# Altium footprint library Connect.PcbLib: 272 footprints (part 1 of 17)
Each footprint in its own frame and in the unit in brackets; x right, y up, seen from the top. Pads: shape width x height; smd on the part's side, far side on the other; paste and mask are expansions set on the pad; w line width, h text height; cw(c..) or ccw(c..) is an arc to the next point about the centre after c.
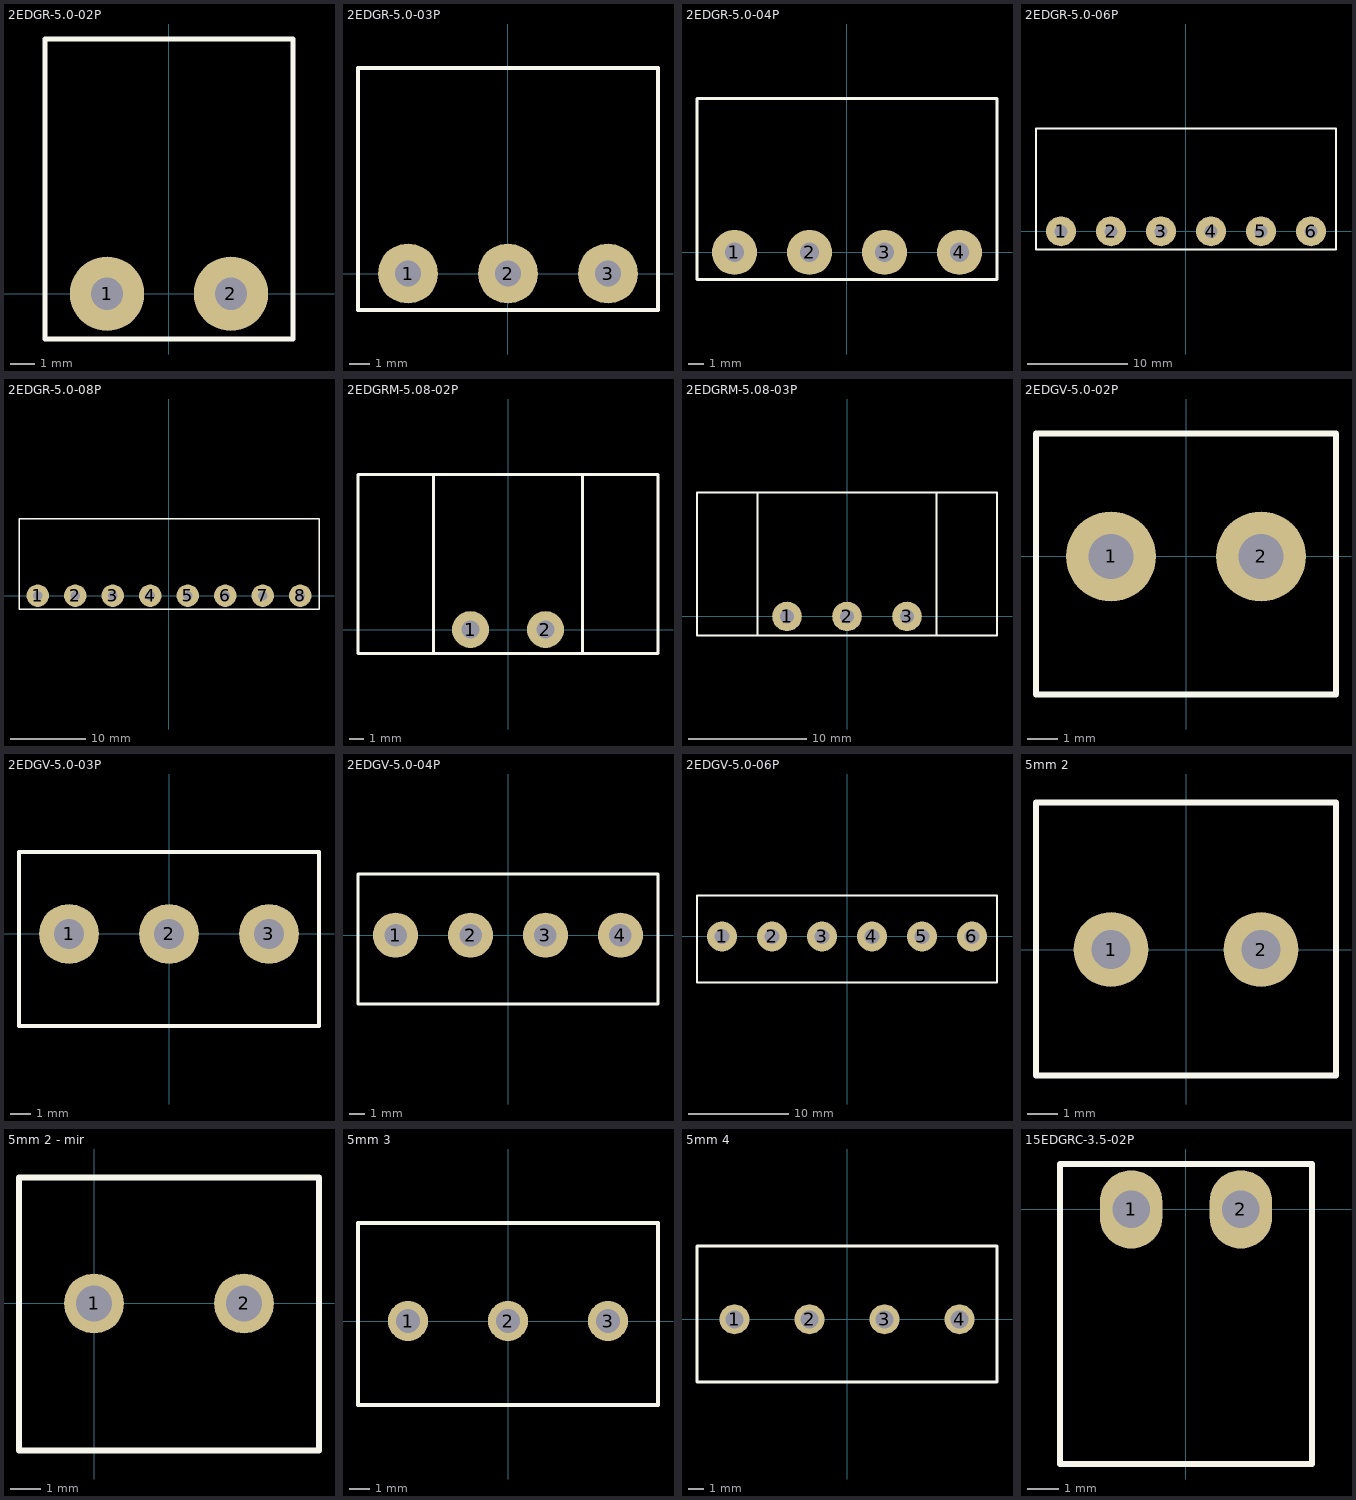
[diagram p0: the footprints below, top view; thin cyan lines are the x and y axes]

## 2EDGR-5.0-02P [mm]
pads (2):
  round 3 hole 1.3: 1(-2.5,0) 2(2.5,0)
Top Overlay:
  lines w0.2: -5,-1.825 -5,10.275 5,10.275 5,-1.825 -5,-1.825
3D body "5mm_2P.STEP": height 8.47, standoff -4, extent -5,-1.75 5,10.25

## 2EDGR-5.0-03P [mm]
pads (3):
  round 3 hole 1.3: 1(-5,0) 2(0,0) 3(5,0)
Top Overlay:
  lines w0.2: -7.5,-1.825 -7.5,10.275 7.5,10.275 7.5,-1.825 -7.5,-1.825
3D body "5mm_2P.STEP": height 8.47, standoff -4, extent -2.5,-1.75 7.5,10.25
3D body "5mm_2P.STEP": height 8.47, standoff -4, extent -7.5,-1.75 2.5,10.25

## 2EDGR-5.0-04P [mm]
pads (4):
  round 3 hole 1.3: 1(-7.5,0) 2(-2.5,0) 3(2.5,0) 4(7.5,0)
Top Overlay:
  lines w0.2: -5,-1.825 5,-1.825 ; -5,10.275 5,10.275 ; -10,-1.825 0,-1.825 10,-1.825 10,10.275 0,10.275 -10,10.275 -10,-1.825
3D body "5mm_2P.STEP": height 8.47, standoff -4, extent 0,-1.75 10,10.25
3D body "5mm_2P.STEP": height 8.47, standoff -4, extent -10,-1.75 0,10.25

## 2EDGR-5.0-06P [mm]
pads (6):
  round 3 hole 1.3: 1(-12.5,0) 2(-7.5,0) 3(-2.5,0) 4(2.5,0) 5(7.5,0) 6(12.5,0)
Top Overlay:
  lines w0.2: -10,-1.825 0,-1.825 ; -10,10.275 0,10.275 ; -15,-1.825 -15,10.275 -5,10.275 5,10.275 15,10.275 15,-1.825 5,-1.825 -5,-1.825 -15,-1.825
3D body "5mm_2P.STEP": height 8.47, standoff -4, extent -15,-1.75 -5,10.25
3D body "5mm_2P.STEP": height 8.47, standoff -4, extent -5,-1.75 5,10.25
3D body "5mm_2P.STEP": height 8.47, standoff -4, extent 5,-1.75 15,10.25

## 2EDGR-5.0-08P [mm]
pads (8):
  round 3 hole 1.3: 1(-17.5,0) 2(-12.5,0) 3(-7.5,0) 4(-2.5,0) 5(2.5,0) 6(7.5,0) 7(12.5,0) 8(17.5,0)
Top Overlay:
  lines w0.2: -15,-1.825 -5,-1.825 ; -15,10.275 -5,10.275 ; -20,-1.825 -20,10.275 -10,10.275 0,10.275 10,10.275 20,10.275 20,-1.825 10,-1.825 0,-1.825 -10,-1.825 -20,-1.825
3D body "5mm_2P.STEP": height 8.47, standoff -4, extent 10,-1.75 20,10.25
3D body "5mm_2P.STEP": height 8.47, standoff -4, extent 0,-1.75 10,10.25
3D body "5mm_2P.STEP": height 8.47, standoff -4, extent -20,-1.75 -10,10.25
3D body "5mm_2P.STEP": height 8.47, standoff -4, extent -10,-1.75 0,10.25

## 2EDGRM-5.08-02P [mm]
pads (2):
  round 2.5 hole 1.2: 1(-2.54,0) 2(2.54,0)
Top Overlay:
  lines w0.2: -5.04,-1.61 -10.16,-1.61 -10.16,10.49 -5.04,10.49 ; -5.04,-1.61 -5.04,10.49 ; -5.04,-1.61 5.04,-1.61 ; -5.04,10.49 5.04,10.49 ; 5.04,-1.61 5.04,10.49 ; 5.04,-1.61 10.16,-1.61 10.16,10.49 5.04,10.49
3D body: height 8, standoff 0, extent -10.15,-1.535 -4.99,10.465
3D body: height 8, standoff 0, extent 4.99,-1.535 10.15,10.465
3D body "5mm_2P.STEP": height 8.47, standoff -4, extent -4.99,-1.535 5.01,10.465
3D body: height 5.25, standoff 2.75, extent -8.745,0.525 -6.25,10.525
3D body: height 5.75, standoff 2.25, extent -9.25,0.5 -5.755,10.5
3D body: height 5.75, standoff 2.25, extent 5.755,0.5 9.25,10.5
3D body: height 5.25, standoff 2.75, extent 6.25,0.525 8.745,10.525

## 2EDGRM-5.08-03P [mm]
pads (3):
  round 2.5 hole 1.2: 1(-5.08,0) 2(0,0) 3(5.08,0)
Top Overlay:
  lines w0.2: -7.58,-1.61 7.58,-1.61 ; -7.58,-1.61 -7.58,10.49 ; -7.58,-1.61 -12.7,-1.61 -12.7,10.49 -7.58,10.49 ; -7.58,10.49 7.58,10.49 ; 7.58,-1.61 7.58,10.49 ; 7.58,-1.61 12.7,-1.61 12.7,10.49 7.58,10.49
3D body: height 5.25, standoff 2.75, extent -11.285,0.525 -8.79,10.525
3D body: height 5.75, standoff 2.25, extent -11.79,0.5 -8.295,10.5
3D body: height 5.25, standoff 2.75, extent 8.79,0.525 11.285,10.525
3D body: height 5.75, standoff 2.25, extent 8.295,0.5 11.79,10.5
3D body "5mm_2P.STEP": height 8.47, standoff -4, extent -2.45,-1.535 7.55,10.465
3D body "5mm_2P.STEP": height 8.47, standoff -4, extent -7.53,-1.535 2.47,10.465
3D body: height 8, standoff 0, extent 7.53,-1.535 12.69,10.465
3D body: height 8, standoff 0, extent -12.69,-1.535 -7.53,10.465

## 2EDGV-5.0-02P [mm]
pads (2):
  round 3 hole 1.5: 1(-2.5,0) 2(2.5,0)
Top Overlay:
  lines w0.2: -5,-4.6 5,-4.6 5,4.1 -5,4.1 -5,-4.6
3D body "2EDGV-5.0.STEP": height 12, standoff -4.5, extent -5,-4.496 5,3.975

## 2EDGV-5.0-03P [mm]
pads (3):
  round 3 hole 1.5: 1(-5,0) 2(0,0) 3(5,0)
Top Overlay:
  lines w0.2: -7.5,-4.6 -7.5,4.1 7.5,4.1 7.5,-4.6 -7.5,-4.6
3D body "2EDGV-5.0.STEP": height 12, standoff -4.5, extent -2.5,-4.496 7.5,3.975
3D body "2EDGV-5.0.STEP": height 12, standoff -4.5, extent -7.5,-4.496 2.5,3.975

## 2EDGV-5.0-04P [mm]
pads (4):
  round 3 hole 1.5: 1(-7.5,0) 2(-2.5,0) 3(2.5,0) 4(7.5,0)
Top Overlay:
  lines w0.2: -10,-4.6 -10,4.1 10,4.1 10,-4.6 -10,-4.6
3D body "2EDGV-5.0.STEP": height 12, standoff -4.5, extent -10,-4.496 0,3.975
3D body "2EDGV-5.0.STEP": height 12, standoff -4.5, extent 0,-4.496 10,3.975

## 2EDGV-5.0-06P [mm]
pads (6):
  round 3 hole 1.5: 1(-12.5,0) 2(-7.5,0) 3(-2.5,0) 4(2.5,0) 5(7.5,0) 6(12.5,0)
Top Overlay:
  lines w0.2: -15,-4.6 -15,4.1 15,4.1 15,-4.6 -15,-4.6
3D body "2EDGV-5.0.STEP": height 12, standoff -4.5, extent -15,-4.496 -5,3.975
3D body "2EDGV-5.0.STEP": height 12, standoff -4.5, extent -5,-4.496 5,3.975
3D body "2EDGV-5.0.STEP": height 12, standoff -4.5, extent 5,-4.496 15,3.975

## 5mm 2 [mm]
pads (2):
  round 2.5 hole 1.3: 1(-2.5,0) 2(2.5,0)
Top Overlay:
  lines w0.2: -5,-4.2 5,-4.2 5,4.9 -5,4.9 -5,0 -5,-4.2
3D body "DG300-5_0-02P-12.STEP": height 12.6, standoff -4.4, extent -5,-4 5,5

## 5mm 2 - mir [mm]
pads (2):
  round 2 hole 1.2: 1(0,0) 2(5,0)
Top Overlay:
  lines w0.2: -2.5,-4.9 7.5,-4.9 7.5,0 7.5,4.2 -2.5,4.2 -2.5,-4.9
3D body "DG300-5_0-02P-12.STEP": height 12.6, standoff -4.4, extent -2.5,-5 7.5,4

## 5mm 3 [mm]
pads (3):
  round 2 hole 1.2: 1(-5,0) 2(0,0) 3(5,0)
Top Overlay:
  lines w0.2: -7.5,-4.2 -7.5,4.9 7.5,4.9 7.5,-4.2 -7.5,-4.2
3D body "DG300-5_0-02P-12.STEP": height 12.6, standoff -4.4, extent -7.5,-4 2.5,5
3D body "DG300-5_0-02P-12.STEP": height 12.6, standoff -4.4, extent -2.5,-4 7.5,5

## 5mm 4 [mm]
pads (4):
  round 2 hole 1.2: 1(-7.5,0) 2(-2.5,0) 3(2.5,0) 4(7.5,0)
Top Overlay:
  lines w0.2: -10,-4.2 10,-4.2 10,4.9 -10,4.9 -10,-4.2
3D body "DG300-5_0-02P-12.STEP": height 12.6, standoff -4.4, extent 0,-4 10,5
3D body "DG300-5_0-02P-12.STEP": height 12.6, standoff -4.4, extent -10,-4 0,5

## 15EDGRC-3.5-02P [mm]
height 7
pads (2):
  oval 2x2.5 hole 1.2: 1(-1.75,0) 2(1.75,0)
Top Overlay:
  lines w0.2: -4.025,-8.125 -4.025,1.45 4.025,1.45 4.025,-8.125 -4.025,-8.125
3D body "15EDGRC-3_5-2.STEP": height 7.2, standoff -3.4, extent -3.9,-8 3.9,1.2